# Altium integrated library Integrated_Library - 02.02.25 - 22.49.IntLib: 792 symbols (part 1 of 11)
Pins are listed as number, name and electrical type; pins without a type are passive.

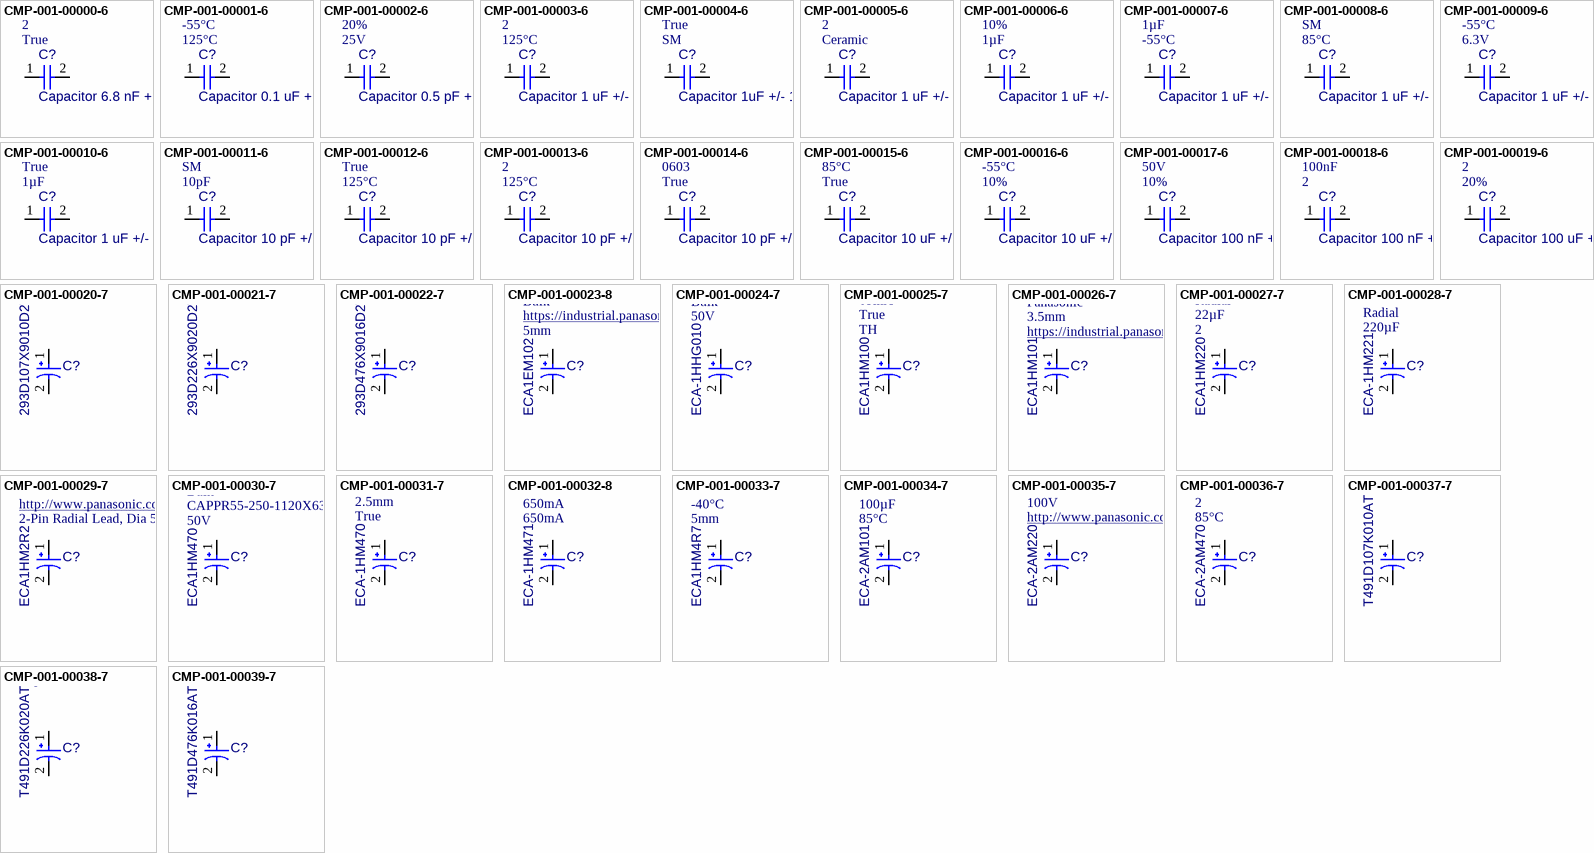
[diagram p0: symbols CMP-001-00000-6 to CMP-001-00039-7]

## CMP-001-00000-6
designator C?, comment Capacitor 6.8 nF +/- 10% 16 V 0402  value 6.8nF  RoHS Compliant: True  Pins: 2  Capacitor Type: Ceramic  Case/Package: 0402  Min Operating Temperature: -55°C  Tolerance: 10%  Voltage Rating: 16V  Mounting Technology: SM  Max Operating Temperature: 125°C
Chip Capacitor, 6.8 nF, +/- 10%, 16 V, 0402 (1005 Metric)
footprint CAPC0603(1608)100_L (Chip Capacitor, Body 1.6x0.8mm, Height 1.0mm, IPC High Density)
footprint CAPC1005X56X25ML10T15 (Chip Capacitor, 2-Leads, Body 1.10x0.60mm, IPC Low Density)
footprint CAPC1005X56X25LL10T15 (Chip Capacitor, 2-Leads, Body 1.10x0.60mm, IPC High Density)
footprint CAPC1005X56X25NL10T15 (Chip Capacitor, 2-Leads, Body 1.10x0.60mm, IPC Medium Density)
pins: 1, 2

## CMP-001-00001-6
designator C?, comment Capacitor 0.1 uF +/- 5% 16 V 0402  value 100nF  Max Operating Temperature: 125°C  Min Operating Temperature: -55°C  Capacitor Type: Ceramic  Case/Package: 0402  Mounting Technology: SM  Pins: 2  Voltage Rating: 16V  Tolerance: 5%  RoHS Compliant: True
Chip Capacitor, 0.1 uF, +/- 5%, 16 V, 0402 (1005 Metric)
footprint CAPC0603(1608)100_L (Chip Capacitor, Body 1.6x0.8mm, Height 1.0mm, IPC High Density)
footprint CAPC1005X56X25ML10T15 (Chip Capacitor, 2-Leads, Body 1.10x0.60mm, IPC Low Density)
footprint CAPC1005X56X25LL10T15 (Chip Capacitor, 2-Leads, Body 1.10x0.60mm, IPC High Density)
footprint CAPC1005X56X25NL10T15 (Chip Capacitor, 2-Leads, Body 1.10x0.60mm, IPC Medium Density)
pins: 1, 2

## CMP-001-00002-6
designator C?, comment Capacitor 0.5 pF +/- 0.1pF 25 V 0402  value 0.5pF  Voltage Rating: 25V  Tolerance: 20%  Max Operating Temperature: 125°C  Capacitor Type: Ceramic  Case/Package: 0402  Pins: 2  RoHS Compliant: True  Min Operating Temperature: -55°C  Mounting Technology: SM
Chip Capacitor, 0.5 pF, +/- 0.1pF, 25 V, 0402 (1005 Metric)
footprint CAPC0603(1608)100_L (Chip Capacitor, Body 1.6x0.8mm, Height 1.0mm, IPC High Density)
footprint CAPC1005X56X25ML10T15 (Chip Capacitor, 2-Leads, Body 1.10x0.60mm, IPC Low Density)
footprint CAPC1005X56X25LL10T15 (Chip Capacitor, 2-Leads, Body 1.10x0.60mm, IPC High Density)
footprint CAPC1005X56X25NL10T15 (Chip Capacitor, 2-Leads, Body 1.10x0.60mm, IPC Medium Density)
pins: 1, 2

## CMP-001-00003-6
designator C?, comment Capacitor 1 uF +/- 10% 16 V 0603  value 1µF  Max Operating Temperature: 125°C  Pins: 2  Tolerance: 10%  Min Operating Temperature: -55°C  RoHS Compliant: True  Voltage Rating: 16V  Mounting Technology: SM  Capacitor Type: Ceramic  Case/Package: 0603
Chip Capacitor, 1 uF, +/- 10%, 16 V, 0603 (1608 Metric)
footprint CAPC0603(1608)100_L (Chip Capacitor, Body 1.6x0.8mm, Height 1.0mm, IPC High Density)
footprint CAPC1608X94X35ML15T15 (Chip Capacitor, 2-Leads, Body 1.75x0.96mm, IPC Low Density)
footprint CAPC1608X94X35LL15T15 (Chip Capacitor, 2-Leads, Body 1.75x0.96mm, IPC High Density)
footprint CAPC1608X94X35NL15T15 (Chip Capacitor, 2-Leads, Body 1.75x0.96mm, IPC Medium Density)
pins: 1, 2

## CMP-001-00004-6
designator C?, comment Capacitor 1uF +/- 10% 16V 0603  value 1µF  Mounting Technology: SM  RoHS Compliant: True  Min Operating Temperature: -55°C  Case/Package: 0603  Pins: 2  Voltage Rating: 16V  Max Operating Temperature: 125°C  Tolerance: 10%  Capacitor Type: Ceramic
Chip Capacitor, 1 uF, +/- 10%, 16 V, 0603 (1608 Metric)
footprint CAPC0603(1608)100_L (Chip Capacitor, Body 1.6x0.8mm, Height 1.0mm, IPC High Density)
footprint CAPC1608X90X35ML15T15 (Chip Capacitor, 2-Leads, Body 1.75x0.95mm, IPC Low Density)
footprint CAPC1608X90X35LL15T15 (Chip Capacitor, 2-Leads, Body 1.75x0.95mm, IPC High Density)
footprint CAPC1608X90X35NL15T15 (Chip Capacitor, 2-Leads, Body 1.75x0.95mm, IPC Medium Density)
pins: 1, 2

## CMP-001-00005-6
designator C?, comment Capacitor 1 uF +/- 10% 25 V 0603  value 1µF  Capacitor Type: Ceramic  Pins: 2  Voltage Rating: 25V  Mounting Technology: SM  RoHS Compliant: True  Max Operating Temperature: 125°C  Case/Package: 0603  Min Operating Temperature: -55°C  Tolerance: 10%
Chip Capacitor, 1 uF, +/- 10%, 25 V, 0603 (1608 Metric)
footprint CAPC0603(1608)100_L (Chip Capacitor, Body 1.6x0.8mm, Height 1.0mm, IPC High Density)
footprint CAPC1608X90X40NL10T20 (Chip Capacitor, 2-Leads, Body 1.70x0.90mm, IPC Medium Density)
footprint CAPC1608X90X40LL10T20 (Chip Capacitor, 2-Leads, Body 1.70x0.90mm, IPC High Density)
footprint CAPC1608X90X40ML10T20 (Chip Capacitor, 2-Leads, Body 1.70x0.90mm, IPC Low Density)
pins: 1, 2

## CMP-001-00006-6
designator C?, comment Capacitor 1 uF +/- 10% 25 V 1206  value 1µF  Tolerance: 10%  Min Operating Temperature: -55°C  Pins: 2  Case/Package: 1206  Max Operating Temperature: 125°C  Capacitor Type: Ceramic  Voltage Rating: 25V  Mounting Technology: SM  RoHS Compliant: True
Chip Capacitor, 1 uF, +/- 10%, 25 V, 1206 (3216 Metric)
footprint CAPC0603(1608)100_L (Chip Capacitor, Body 1.6x0.8mm, Height 1.0mm, IPC High Density)
footprint CAPC3216X180X20LL20 (Chip Capacitor, 2-Leads, Body 3.40x1.80mm, IPC High Density)
footprint CAPC3216X180X20NL20 (Chip Capacitor, 2-Leads, Body 3.40x1.80mm, IPC Medium Density)
footprint CAPC3216X180X20ML20 (Chip Capacitor, 2-Leads, Body 3.40x1.80mm, IPC Low Density)
pins: 1, 2

## CMP-001-00007-6
designator C?, comment Capacitor 1 uF +/- 10% 50 V 0805  value 1µF  Min Operating Temperature: -55°C  RoHS Compliant: True  Capacitor Type: Ceramic  Mounting Technology: SM  Case/Package: 0805  Max Operating Temperature: 125°C  Voltage Rating: 50V  Tolerance: 10%  Pins: 2
Chip Capacitor, 1 uF, +/- 10%, 50 V, 0805 (2012 Metric)
footprint CAPC0603(1608)100_L (Chip Capacitor, Body 1.6x0.8mm, Height 1.0mm, IPC High Density)
footprint CAPC2013X135X45LL10T25 (Chip Capacitor, 2-Leads, Body 2.10x1.35mm, IPC High Density)
footprint CAPC2013X135X45NL10T25 (Chip Capacitor, 2-Leads, Body 2.10x1.35mm, IPC Medium Density)
footprint CAPC2013X135X45ML10T25 (Chip Capacitor, 2-Leads, Body 2.10x1.35mm, IPC Low Density)
pins: 1, 2

## CMP-001-00008-6
designator C?, comment Capacitor 1 uF +/- 10% 6.3 V 0402  value 1µF  Max Operating Temperature: 85°C  Mounting Technology: SM  Tolerance: 10%  Case/Package: 0402  Capacitor Type: Ceramic  RoHS Compliant: True  Voltage Rating: 6.3V  Min Operating Temperature: -55°C  Pins: 2
Chip Capacitor, 1 uF, +/- 10%, 6.3 V, 0402 (1005 Metric)
footprint CAPC0603(1608)100_L (Chip Capacitor, Body 1.6x0.8mm, Height 1.0mm, IPC High Density)
footprint CAPC1005X55X25ML05T10 (Chip Capacitor, 2-Leads, Body 1.00x0.50mm, IPC Low Density)
footprint CAPC1005X55X25LL05T10 (Chip Capacitor, 2-Leads, Body 1.00x0.50mm, IPC High Density)
footprint CAPC1005X55X25NL05T10 (Chip Capacitor, 2-Leads, Body 1.00x0.50mm, IPC Medium Density)
pins: 1, 2

## CMP-001-00009-6
designator C?, comment Capacitor 1 uF +/- 10% 6.3 V 1005  value 1µF  Voltage Rating: 6.3V  Min Operating Temperature: -55°C  Case/Package: 0402  Capacitor Type: Ceramic  Tolerance: 10%  Mounting Technology: SM  Max Operating Temperature: 85°C  RoHS Compliant: True  Pins: 2
Chip Capacitor, 1 uF, +/- 10%, 6.3 V, 1005 (0402 Metric)
footprint CAPC0603(1608)100_L (Chip Capacitor, Body 1.6x0.8mm, Height 1.0mm, IPC High Density)
footprint CAPC1005X55X25NL5T10 (Chip Capacitor, 2-Leads, Body 1.05x0.55mm, IPC Medium Density)
footprint CAPC1005X55X25LL5T10 (Chip Capacitor, 2-Leads, Body 1.05x0.55mm, IPC High Density)
footprint CAPC1005X55X25ML5T10 (Chip Capacitor, 2-Leads, Body 1.05x0.55mm, IPC Low Density)
pins: 1, 2

## CMP-001-00010-6
designator C?, comment Capacitor 1 uF +/- 10% 25 V 0805  value 1µF  RoHS Compliant: True  Pins: 2  Capacitor Type: Ceramic  Mounting Technology: SM  Max Operating Temperature: 125°C  Min Operating Temperature: -55°C  Voltage Rating: 25V  Tolerance: 10%  Case/Package: 0805
Chip Capacitor, 1 uF, +/-10%, 25 V, 0805 (2012 Metric)
footprint CAPC0603(1608)100_L (Chip Capacitor, Body 1.6x0.8mm, Height 1.0mm, IPC High Density)
footprint CAPC2013X145X50ML20T25 (Chip Capacitor, 2-Leads, Body 2.2x1.45mm, IPC Low Density)
footprint CAPC2013X145X50LL20T25 (Chip Capacitor, 2-Leads, Body 2.2x1.45mm, IPC High Density)
footprint CAPC2013X145X50NL20T25 (Chip Capacitor, 2-Leads, Body 2.2x1.45mm, IPC Medium Density)
pins: 1, 2

## CMP-001-00011-6
designator C?, comment Capacitor 10 pF +/- 0.25 pF 50 V 0402  value 10pF  Mounting Technology: SM  Voltage Rating: 50V  Pins: 2  Tolerance: 0.25%  Case/Package: 0402  Min Operating Temperature: -55°C  RoHS Compliant: True  Max Operating Temperature: 125°C  Capacitor Type: Ceramic
Chip Capacitor, 10 pF, +/- 0.25 pF, 50 V, 0402 (1005 Metric)
footprint CAPC0603(1608)100_L (Chip Capacitor, Body 1.6x0.8mm, Height 1.0mm, IPC High Density)
footprint CAPC1005X55X30NL05T10 (Chip Capacitor, 2-Leads, Body 1.05x0.55mm, IPC Medium Density)
footprint CAPC1005X55X30ML05T10 (Chip Capacitor, 2-Leads, Body 1.05x0.55mm, IPC Low Density)
footprint CAPC1005X55X30LL05T10 (Chip Capacitor, 2-Leads, Body 1.05x0.55mm, IPC High Density)
pins: 1, 2

## CMP-001-00012-6
designator C?, comment Capacitor 10 pF +/- 0.25 pF 50 V 0603  value 10pF  Max Operating Temperature: 125°C  RoHS Compliant: True  Mounting Technology: SM  Tolerance: 0.25%  Pins: 2  Case/Package: 0603  Min Operating Temperature: -55°C  Capacitor Type: Ceramic  Voltage Rating: 50V
Chip Capacitor, 10 pF, +/- 0.25 pF, 50 V, 0603 (1608 Metric)
footprint CAPC0603(1608)100_L (Chip Capacitor, Body 1.6x0.8mm, Height 1.0mm, IPC High Density)
footprint CAPC1608X87X35LL15T15 (Chip Capacitor, 2-Leads, Body 1.75x0.95mm, IPC High Density)
footprint CAPC1608X87X35ML15T15 (Chip Capacitor, 2-Leads, Body 1.75x0.95mm, IPC Low Density)
footprint CAPC1608X87X35NL15T15 (Chip Capacitor, 2-Leads, Body 1.75x0.95mm, IPC Medium Density)
pins: 1, 2

## CMP-001-00013-6
designator C?, comment Capacitor 10 pF +/- 5% 50 V 0402  value 10pF  Max Operating Temperature: 125°C  Pins: 2  Capacitor Type: Ceramic  Mounting Technology: SM  Tolerance: 5%  RoHS Compliant: True  Case/Package: 0402  Min Operating Temperature: -55°C  Voltage Rating: 50V
Chip Capacitor, 10 pF, +/- 5%, 50 V, 0402 (1005 Metric)
footprint CAPC0603(1608)100_L (Chip Capacitor, Body 1.6x0.8mm, Height 1.0mm, IPC High Density)
footprint CAPC1005X55X25LL05T05 (Chip Capacitor, 2-Leads, Body 1.05x0.55mm, IPC High Density)
footprint CAPC1005X55X25NL05T05 (Chip Capacitor, 2-Leads, Body 1.05x0.55mm, IPC Medium Density)
footprint CAPC1005X55X25ML05T05 (Chip Capacitor, 2-Leads, Body 1.05x0.55mm, IPC Low Density)
pins: 1, 2

## CMP-001-00014-6
designator C?, comment Capacitor 10 pF +/- 5% 50 V 0603  value 10pF  RoHS Compliant: True  Case/Package: 0603  Max Operating Temperature: 125°C  Capacitor Type: Ceramic  Pins: 2  Tolerance: 5%  Mounting Technology: SM  Voltage Rating: 50V  Min Operating Temperature: -55°C
Chip Capacitor, 10 pF, +/- 5%, 50 V, 0603 (1608 Metric)
footprint CAPC0603(1608)100_L (Chip Capacitor, Body 1.6x0.8mm, Height 1.0mm, IPC High Density)
footprint CAPC1608X90X40NL10T20 (Chip Capacitor, 2-Leads, Body 1.70x0.90mm, IPC Medium Density)
footprint CAPC1608X90X40LL10T20 (Chip Capacitor, 2-Leads, Body 1.70x0.90mm, IPC High Density)
footprint CAPC1608X90X40ML10T20 (Chip Capacitor, 2-Leads, Body 1.70x0.90mm, IPC Low Density)
pins: 1, 2

## CMP-001-00015-6
designator C?, comment Capacitor 10 uF +/- 10% 16 V 0805  value 10µF  RoHS Compliant: True  Max Operating Temperature: 85°C  Voltage Rating: 16V  Min Operating Temperature: -55°C  Capacitor Type: Ceramic  Mounting Technology: SM  Tolerance: 10%  Case/Package: 0805  Pins: 2
Chip Capacitor, 10 uF, +/- 10%, 16 V, 0805 (2012 Metric)
footprint CAPC0603(1608)100_L (Chip Capacitor, Body 1.6x0.8mm, Height 1.0mm, IPC High Density)
footprint CAPC2013X135X45LL10T25 (Chip Capacitor, 2-Leads, Body 2.10x1.35mm, IPC High Density)
footprint CAPC2013X135X45NL10T25 (Chip Capacitor, 2-Leads, Body 2.10x1.35mm, IPC Medium Density)
footprint CAPC2013X135X45ML10T25 (Chip Capacitor, 2-Leads, Body 2.10x1.35mm, IPC Low Density)
pins: 1, 2

## CMP-001-00016-6
designator C?, comment Capacitor 10 uF +/- 10% 16 V 1206  value 10µF  Tolerance: 10%  Min Operating Temperature: -55°C  Capacitor Type: Ceramic  Voltage Rating: 16V  Pins: 2  Mounting Technology: SM  Case/Package: 1206  Max Operating Temperature: 125°C  RoHS Compliant: True
Chip Capacitor, 10 uF, +/- 10%, 16 V, 1206 (3216 Metric)
footprint CAPC0603(1608)100_L (Chip Capacitor, Body 1.6x0.8mm, Height 1.0mm, IPC High Density)
footprint CAPC3216X180X50NL20T25 (Chip Capacitor, 2-Leads, Body 3.40x1.80mm, IPC Medium Density)
footprint CAPC3216X180X50ML20T25 (Chip Capacitor, 2-Leads, Body 3.40x1.80mm, IPC Low Density)
footprint CAPC3216X180X50LL20T25 (Chip Capacitor, 2-Leads, Body 3.40x1.80mm, IPC High Density)
pins: 1, 2

## CMP-001-00017-6
designator C?, comment Capacitor 100 nF +/-10% 50 V 0603  value 100nF  Tolerance: 10%  Voltage Rating: 50V  Mounting Technology: SM  Max Operating Temperature: 125°C  RoHS Compliant: True  Pins: 2  Capacitor Type: Ceramic  Case/Package: 0603  Min Operating Temperature: -55°C
Chip Capacitor, 100 nF, +/- 10%, 50 V, 0603 (1608 Metric)
footprint CAPC0603(1608)100_L (Chip Capacitor, Body 1.6x0.8mm, Height 1.0mm, IPC High Density)
footprint CAPC1608X90X40NL10T20 (Chip Capacitor, 2-Leads, Body 1.70x0.90mm, IPC Medium Density)
footprint CAPC1608X90X40LL10T20 (Chip Capacitor, 2-Leads, Body 1.70x0.90mm, IPC High Density)
footprint CAPC1608X90X40ML10T20 (Chip Capacitor, 2-Leads, Body 1.70x0.90mm, IPC Low Density)
pins: 1, 2

## CMP-001-00018-6
designator C?, comment Capacitor 100 nF +/-10% 50 V 0805  value 100nF  Pins: 2  Max Operating Temperature: 125°C  Min Operating Temperature: -55°C  Mounting Technology: SM  Case/Package: 0805  Capacitor Type: Ceramic  Voltage Rating: 50V  RoHS Compliant: True  Tolerance: 10%
Chip Capacitor, 100 nF, +/- 10%, 50 V, 0805 (2012 Metric)
footprint CAPC0603(1608)100_L (Chip Capacitor, Body 1.6x0.8mm, Height 1.0mm, IPC High Density)
footprint CAPC2013X95X50LL10T25 (Chip Capacitor, 2-Leads, Body 2.10x1.35mm, IPC High Density)
footprint CAPC2013X95X50NL10T25 (Chip Capacitor, 2-Leads, Body 2.10x1.35mm, IPC Medium Density)
footprint CAPC2013X95X50ML10T25 (Chip Capacitor, 2-Leads, Body 2.10x1.35mm, IPC Low Density)
pins: 1, 2

## CMP-001-00019-6
designator C?, comment Capacitor 100 uF +/- 20% 6.3 V 1206  value 100µF  Tolerance: 20%  Pins: 2  Case/Package: 1206  Voltage Rating: 6.3V  Max Operating Temperature: 85°C  RoHS Compliant: True  Capacitor Type: Ceramic  Mounting Technology: SM  Min Operating Temperature: -55°C
Chip Capacitor, 100 uF, +/- 20%, 6.3 V, 1206 (3216 Metric)
footprint CAPC0603(1608)100_L (Chip Capacitor, Body 1.6x0.8mm, Height 1.0mm, IPC High Density)
footprint CAPC3216X190X55LL30T25 (Chip Capacitor, 2-Leads, Body 3.5x1.9mm, IPC High Density)
footprint CAPC3216X190X55ML30T25 (Chip Capacitor, 2-Leads, Body 3.5x1.9mm, IPC Low Density)
footprint CAPC3216X190X55NL30T25 (Chip Capacitor, 2-Leads, Body 3.5x1.9mm, IPC Medium Density)
pins: 1, 2

## CMP-001-00020-7
designator C?, comment 293D107X9010D2TE3  value 100µF  Packaging: TapeandReel  Voltage Rating: 10V  Mounting Technology: SM  Datasheet Version: Aug-16  Min Operating Temperature: -55°C  RoHS Compliant: Unknown  Tolerance: 10%  Package Description: 2-Pin Surface Mount Device, Body 7.3 x 4.3 mm  Case/Package: 7343-31  Max Operating Temperature: 125°C  Manufacturer: Vishay Semiconductor  Capacitor Type: Tantalum
Solid Tantalum Chip Capacitor, 100 uF, +/- 10%, 10 V, -55 to 125 degC, 2917 (7343 Metric), RoHS, Tape and Reel; Manufacturer URL: http://www.vishay.com/; Datasheet URL: http://www.vishay.com/docs/40002/293d.pdf; Package Reference: 7343-31
footprint EEF-CX1E330R-Footprint-1
footprint VISH-7343-31_M (Molded Capacitor, 2-Leads, Body 7.6x4.6mm, IPC Low Density)
footprint VISH-7343-31_L (Molded Capacitor, 2-Leads, Body 7.6x4.6mm, IPC High Density)
footprint VISH-7343-31_N (Molded Capacitor, 2-Leads, Body 7.6x4.6mm, IPC Medium Density)
pins: 1, 2

## CMP-001-00021-7
designator C?, comment 293D226X9020D2TE3  value 22µF  Voltage Rating: 20V  Package Description: 2-Pin Surface Mount Device, Body 7.3 x 4.3 mm  Package Reference: 7343-31  Max Operating Temperature: 125°C  Datasheet Version: Aug-16  RoHS Compliant: Unknown  Min Operating Temperature: -55°C  Manufacturer: Vishay Semiconductor  Packaging: TapeandReel  Mounting Technology: SM  Tolerance: 10%  Capacitor Type: Tantalum
Solid Tantalum Chip Capacitor, 22 uF, +/- 10%, 20 V, -55 to 125 degC, 2917 (7343 Metric), RoHS, Tape and Reel; Case/Package: 7343-31; Manufacturer URL: http://www.vishay.com/; Datasheet URL: http://www.vishay.com/docs/40002/293d.pdf
footprint EEF-CX1E330R-Footprint-1
footprint VISH-7343-31_M (Molded Capacitor, 2-Leads, Body 7.6x4.6mm, IPC Low Density)
footprint VISH-7343-31_L (Molded Capacitor, 2-Leads, Body 7.6x4.6mm, IPC High Density)
footprint VISH-7343-31_N (Molded Capacitor, 2-Leads, Body 7.6x4.6mm, IPC Medium Density)
pins: 1, 2

## CMP-001-00022-7
designator C?, comment 293D476X9016D2TE3  value 47µF  Max Operating Temperature: 125°C  Manufacturer: Vishay Semiconductor  Packaging: TapeandReel  Mounting Technology: SM  Capacitor Type: Tantalum  Tolerance: 10%  Min Operating Temperature: -55°C  Package Reference: 7343-31  RoHS Compliant: Unknown  Datasheet Version: Aug-16  Voltage Rating: 16V  Package Description: 2-Pin Surface Mount Device, Body 7.3 x 4.3 mm
Solid Tantalum Chip Capacitor, 47 uF, +/- 10%, 16 V, -55 to 125 degC, 2917 (7343 Metric), RoHS, Tape and Reel; Datasheet URL: http://www.vishay.com/docs/40002/293d.pdf; Manufacturer URL: http://www.vishay.com/; Case/Package: 7343-31
footprint EEF-CX1E330R-Footprint-1
footprint VISH-7343-31_M (Molded Capacitor, 2-Leads, Body 7.6x4.6mm, IPC Low Density)
footprint VISH-7343-31_L (Molded Capacitor, 2-Leads, Body 7.6x4.6mm, IPC High Density)
footprint VISH-7343-31_N (Molded Capacitor, 2-Leads, Body 7.6x4.6mm, IPC Medium Density)
pins: 1, 2

## CMP-001-00023-8
designator C?, comment ECA1EM102  value 1mF  Lead Pitch: 5mm  Packaging: Bulk  Package Reference: CAPPR65-500-2000X1000X2200  Package Description: 2-Pin Radial Lead, Dia 10 mm, Height 22 mm  Diameter: 10mm  Ripple Current: 850mA  Min Operating Temperature: -40°C  Datasheet Version: Rev. 05, 10/2016  RoHS Compliant: True  Capacitor Type: Electrolytic  Tolerance: 20%  Mounting Technology: TH  Voltage Rating: 25V  Manufacturer: Panasonic  Max Operating Temperature: 85°C  Package Quantity: 200  Case/Package: Radial
Aluminum Electrolytic Capacitor, 1000 uF, +/- 20%, 25 V, -40 to 85 degC, 2-Pin THD, RoHS, Bulk; Datasheet URL: https://industrial.panasonic.com/cdbs/www-data/pdf/RDF0000/ABA0000C1218.pdf; Manufacturer URL: http://www.panasonic.com/
footprint EEF-CX1E330R-Footprint-1
footprint CAPPR65-500-2000X1000X2200 (THD, 2-Leads, Dia 10mm, Pin Spacing 5mm)
pins: 1, 2

## CMP-001-00024-7
designator C?, comment ECA-1HHG010  value 1µF  Voltage Rating: 50V  Packaging: Bulk  Ripple Current: 10mA  Package Quantity: 200  Tolerance: 20%  Min Operating Temperature: -55°C  Diameter: 5mm  Capacitor Type: Electrolytic  Datasheet Version: Mar-05  Case/Package: Radial  Mounting Technology: TH  Manufacturer: Panasonic  Pins: 2  Package Reference: CAPPR55-200-1100X500X1200  Package Description: 2-Pin Radial Lead, Dia 5 mm, Height 12 mm  RoHS Compliant: True  Max Operating Temperature: 105°C  Lead Pitch: 2mm
Aluminum Electrolytic Capacitor, 1 uF, +/- 20%, 50 V, -55 to 105 degC, 2-Pin THD, RoHS, Bulk; Ripple Current (AC): 10mA; Manufacturer URL: http://www.panasonic.com/; Datasheet URL: https://datasheet.ciiva.com/7275/94060-7275472.pdf
footprint EEF-CX1E330R-Footprint-1
footprint CAPPR55-200-1100X500X1200 (THD, 2-Leads, Dia 5mm, Pin Spacing 2mm)
pins: 1, 2

## CMP-001-00025-7
designator C?, comment ECA1HM100  value 10µF  Mounting Technology: TH  RoHS Compliant: True  Ripple Current (AC): 65mA  Capacitor Type: Electrolytic  Datasheet Version: Rev. 05, 10/2016  Min Operating Temperature: -40°C  Manufacturer: Panasonic  Packaging: Bulk  Tolerance: 20%  Max Operating Temperature: 85°C  Voltage Rating: 50V  Lead Pitch: 2mm  Pins: 2  Diameter: 5mm  Package Reference: CAPPR55-200-1100X500X1200  Package Description: 2-Pin Radial Lead, Dia 5 mm, Height 12 mm  Case/Package: Radial  Package Quantity: 200
Aluminum Electrolytic Capacitor, 10 uF, +/- 20%, 50 V, -40 to 85 degC, 2-Pin THD, RoHS, Bulk; Ripple Current: 65mA; Datasheet URL: https://industrial.panasonic.com/cdbs/www-data/pdf/RDF0000/ABA0000C1218.pdf; Manufacturer URL: http://www.panasonic.com/
footprint EEF-CX1E330R-Footprint-1
footprint CAPPR55-200-1100X500X1200 (THD, 2-Leads, Dia 5mm, Pin Spacing 2mm)
pins: 1, 2

## CMP-001-00026-7
designator C?, comment ECA1HM101  value 100µF  Lead Pitch: 3.5mm  Manufacturer: Panasonic  Mounting Technology: TH  Voltage Rating: 50V  Package Description: 2-Pin Radial Lead, Dia 8 mm, Height 12.5 mm  Diameter: 8mm  Ripple Current: 250mA  Capacitor Type: Electrolytic  Max Operating Temperature: 85°C  Pins: 2  Min Operating Temperature: -40°C  Tolerance: 20%  Case/Package: Radial  Packaging: Bulk  Package Quantity: 200  Package Reference: CAPPR65-350-1150X800X1250  RoHS Compliant: True  Datasheet Version: Rev. 05, 10/2016
Aluminum Electrolytic Capacitor, 100 uF, +/- 20%, 50 V, -40 to 85 degC, 2-Pin THD, RoHS, Bulk; Datasheet URL: https://industrial.panasonic.com/cdbs/www-data/pdf/RDF0000/ABA0000C1218.pdf; Ripple Current (AC): 250mA; Manufacturer URL: http://www.panasonic.com/
footprint EEF-CX1E330R-Footprint-1
footprint CAPPR65-350-1150X800X1250 (THD, 2-Leads, Dia 8mm, Pin Spacing 3.5mm)
pins: 1, 2

## CMP-001-00027-7
designator C?, comment ECA1HM220  value 22µF  Pins: 2  Case/Package: Radial  Datasheet Version: Rev. 05, 10/2016  RoHS Compliant: True  Ripple Current (AC): 100mA  Max Operating Temperature: 85°C  Capacitor Type: Electrolytic  Manufacturer: Panasonic  Mounting Technology: TH  Package Quantity: 200  Package Reference: CAPPR55-200-1100X500X1200  Voltage Rating: 50V  Package Description: 2-Pin Radial Lead, Dia 5 mm, Height 12 mm  Packaging: Bulk  Lead Pitch: 2mm  Min Operating Temperature: -40°C  Diameter: 5mm  Tolerance: 20%
Aluminum Electrolytic Capacitor, 22 uF, +/- 20%, 50 V, -40 to 85 degC, 2-Pin THD, RoHS, Bulk; Ripple Current: 100mA; Datasheet URL: https://industrial.panasonic.com/cdbs/www-data/pdf/RDF0000/ABA0000C1218.pdf; Manufacturer URL: http://www.panasonic.com/
footprint EEF-CX1E330R-Footprint-1
footprint CAPPR55-200-1100X500X1200 (THD, 2-Leads, Dia 5mm, Pin Spacing 2mm)
pins: 1, 2

## CMP-001-00028-7
designator C?, comment ECA-1HM221  value 220µF  Case/Package: Radial  Packaging: Bulk  Package Quantity: 200  Min Operating Temperature: -40°C  Datasheet Version: Mar-16  Manufacturer: Panasonic  Package Reference: CAPPR65-500-1250X1000X1350  Mounting Technology: TH  Ripple Current (AC): 400mA  Pins: 2  Package Description: 2-Pin Radial Lead, Dia 10 mm, Body Length 12.5 mm  RoHS Compliant: True  Max Operating Temperature: 85°C  Lead Pitch: 5mm  Tolerance: 20%  Voltage Rating: 50V  Diameter: 10mm  Capacitor Type: Electrolytic
Aluminum Electrolytic Capacitor, 220 uF, +/- 20%, 50 V, -40 to 85 degC, 2-Pin THD, RoHS, Bulk; Ripple Current: 400mA; Manufacturer URL: http://www.panasonic.com/; Datasheet URL: http://industrial.panasonic.com/cdbs/www-data/pdf/RDF0000/DMF0000COL68.pdf
footprint EEF-CX1E330R-Footprint-1
footprint CAPPR65-500-1250X1000X1350 (THD, 2-Leads, Dia 10mm, Body Length 12.5mm)
pins: 1, 2

## CMP-001-00029-7
designator C?, comment ECA1HM2R2  value 2.2µF  Package Description: 2-Pin Radial Lead, Dia 5 mm, Height 12 mm  Tolerance: 20%  Voltage Rating: 50V  Diameter: 5mm  Pins: 2  Mounting Technology: TH  Capacitor Type: Electrolytic  Ripple Current: 20mA  RoHS Compliant: True  Min Operating Temperature: -40°C  Case/Package: Radial  Lead Pitch: 2mm  Manufacturer: Panasonic  Max Operating Temperature: 85°C  Packaging: Bulk  Package Reference: CAPPR55-200-1100X500X1200  Datasheet Version: Rev. 05, 10/2016  Package Quantity: 200
Aluminum Electrolytic Capacitor, 2.2 uF, +/- 20%, 50 V, -40 to 85 degC, 2-Pin THD, RoHS, Bulk; Manufacturer URL: http://www.panasonic.com/; Datasheet URL: https://industrial.panasonic.com/cdbs/www-data/pdf/RDF0000/ABA0000C1218.pdf; Ripple Current (AC): 20mA
footprint EEF-CX1E330R-Footprint-1
footprint CAPPR55-200-1100X500X1200 (THD, 2-Leads, Dia 5mm, Pin Spacing 2mm)
pins: 1, 2

## CMP-001-00030-7
designator C?, comment ECA1HM470  value 47µF  Voltage Rating: 50V  Package Reference: CAPPR55-250-1120X630X1220  Packaging: Bulk  Case/Package: Radial  Pins: 2  Package Description: 2-Pin Radial Lead, Dia 6.3 mm, Height 12.2 mm  Capacitor Type: Electrolytic  Max Operating Temperature: 85°C  Min Operating Temperature: -40°C  Manufacturer: Panasonic  Datasheet Version: Rev. 05, 10/2016  RoHS Compliant: True  Lead Pitch: 2.5mm  Ripple Current: 130mA  Package Quantity: 200  Mounting Technology: TH  Tolerance: 20%  Diameter: 6.3mm
Aluminum Electrolytic Capacitor, 47 uF, +/- 20%, 50 V, -40 to 85 degC, 2-Pin THD, RoHS, Bulk; Manufacturer URL: http://www.panasonic.com/; Ripple Current (AC): 130mA; Datasheet URL: https://industrial.panasonic.com/cdbs/www-data/pdf/RDF0000/ABA0000C1218.pdf
footprint EEF-CX1E330R-Footprint-1
footprint CAPPR55-250-1120X630X1220 (THD, 2-Leads, Dia 6.3mm, Pin Spacing 2.5mm)
pins: 1, 2

## CMP-001-00031-7
designator C?, comment ECA-1HM470  value 47µF  RoHS Compliant: True  Lead Pitch: 2.5mm  Packaging: Bulk  Case/Package: Radial  Diameter: 6.3mm  Datasheet Version: Apr-16  Ripple Current: 130mA  Mounting Technology: TH  Max Operating Temperature: 85°C  Voltage Rating: 50V  Package Quantity: 200  Package Description: 2-Pin Radial Lead, Dia 6.3 mm, Height 12.2 mm  Capacitor Type: Electrolytic  Min Operating Temperature: -40°C  Tolerance: 20%  Pins: 2  Package Reference: CAPPR55-250-1120X630X1220  Manufacturer: Panasonic
Aluminum Electrolytic Capacitor, 47 uF, +/-20%, 50 V, -40 to 85 degC, 2-Pin THD, RoHS, Bulk; Ripple Current (AC): 130mA; Manufacturer URL: http://www.panasonic.com/; Datasheet URL: https://industrial.panasonic.com/cdbs/www-data/pdf/RDF0000/DMF0000COL72.pdf
footprint EEF-CX1E330R-Footprint-1
footprint CAPPR55-250-1120X630X1220 (THD, 2-Leads, Dia 6.3mm, Pin Spacing 2.5mm)
pins: 1, 2
